# Altium footprint library microbuilder.PCBLIB: 422 footprints (part 15 of 27)
Each footprint in its own frame and in the unit in brackets; x right, y up, seen from the top. Pads: shape width x height; smd on the part's side, far side on the other; paste and mask are expansions set on the pad; w line width, h text height; cw(c..) or ccw(c..) is an arc to the next point about the centre after c.
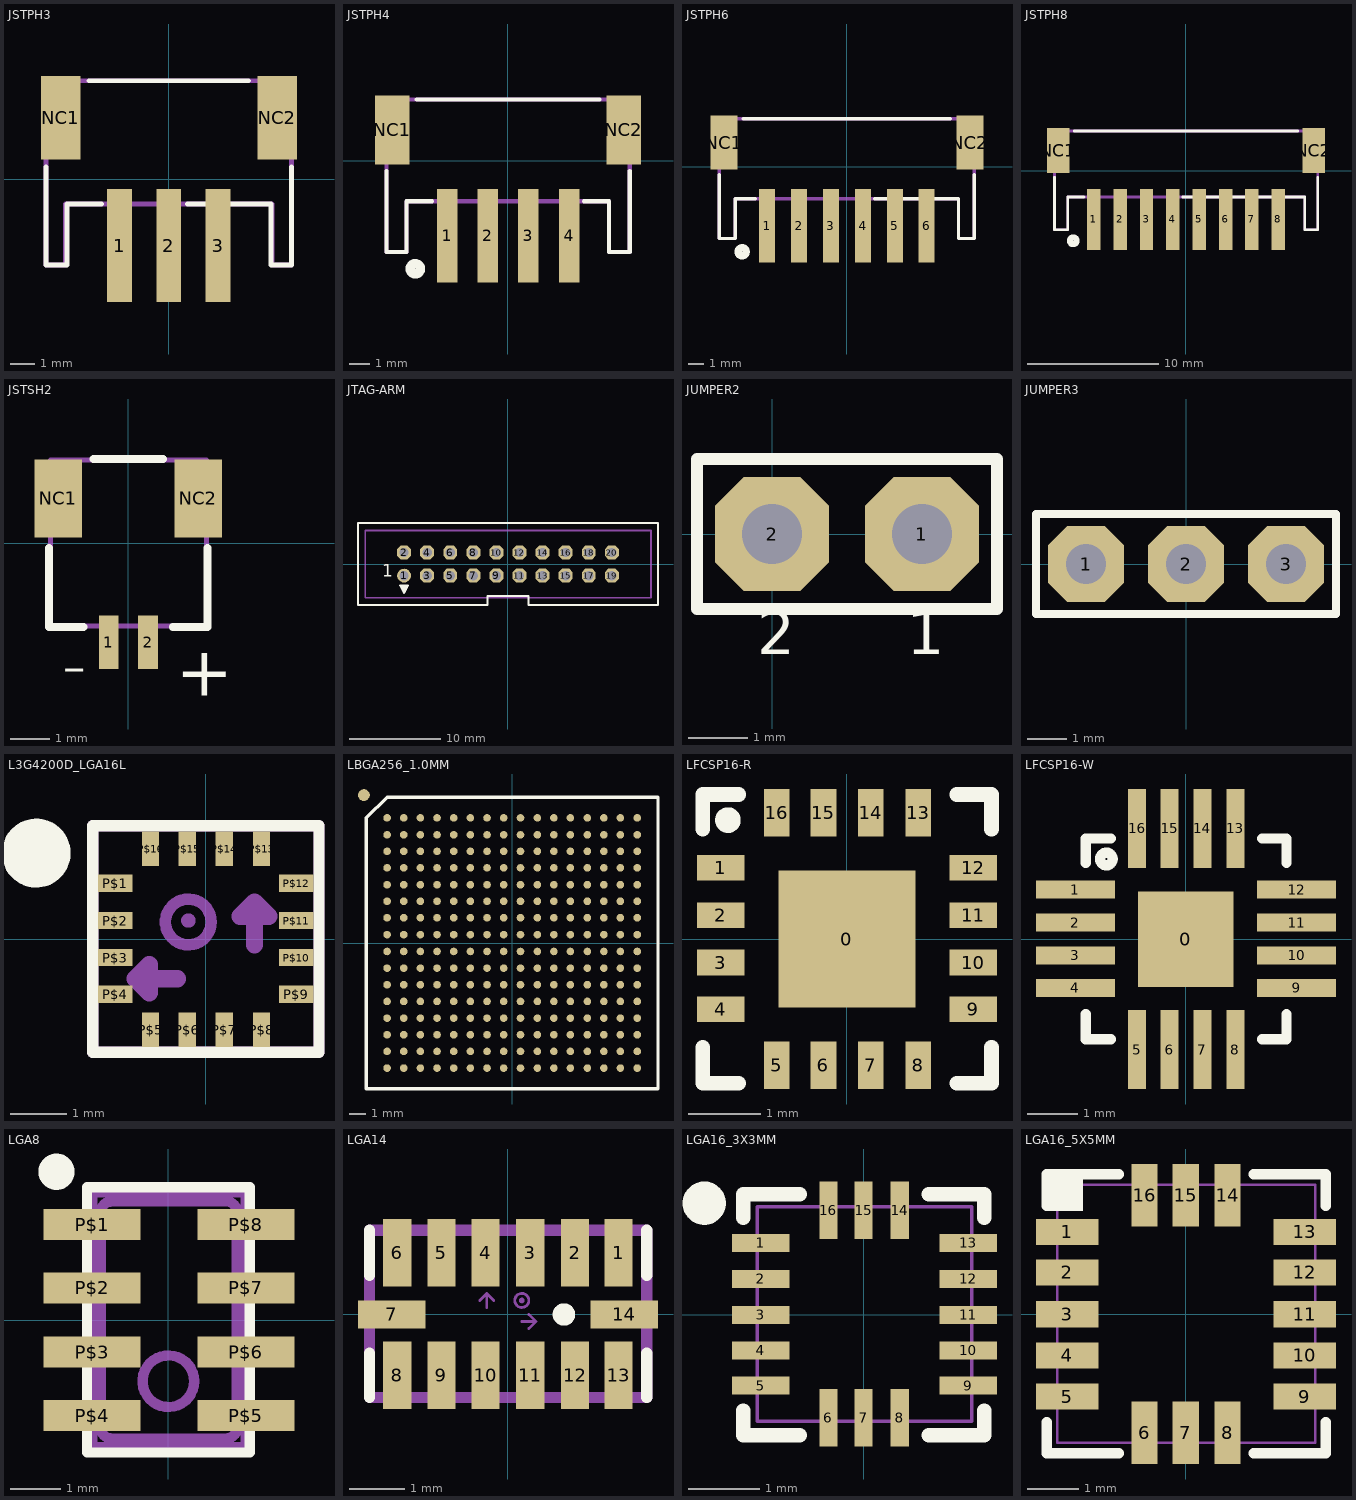
[diagram p14: the footprints below, top view; thin cyan lines are the x and y axes]

## JSTPH3 [mil]
pads (5):
  rect 40x182 smd: 1(-78.74,-106.3) 2(0,-106.3) 3(79,-106.3)
  rect 63x134 smd: NC1(-173.23,99) NC2(174,99)
Top Overlay:
  lines w8: -196.85,20 -196.85,-137.8 -163.39,-137.8 -163.39,-39.37 -108.27,-39.37 ; -127.95,158 128,158 ; 30,-39.37 164,-39.37 164,-137.8 197,-137.8 197,20
Mechanical 16:
  lines w8: -196.85,-137.8 -196.85,158 197,158 197,-137.8 166,-137.8 166,-39.37 -165.35,-39.37 -165.35,-137.8 -196.85,-137.8

## JSTPH4 [mil]
pads (6):
  rect 40x182 smd: 1(-118.11,-145.67) 2(-39.37,-145.67) 3(40,-145.67) 4(119,-145.67)
  rect 67x134 smd: NC1(-224.41,60) NC2(225,60)
Top Overlay:
  circle w18: c-180,-210 r10
  lines w8: -236.22,-19.68 -236.22,-177.17 -196.85,-177.17 -196.85,-78.74 -147.64,-78.74 ; -177.17,119 178,119 ; 148,-78.74 197,-78.74 197,-177.17 237,-177.17 237,-19.68
Mechanical 16:
  lines w8: -236.22,-177.17 -236.22,119 237,119 237,-177.17 197,-177.17 197,-78.74 -196.85,-78.74 -196.85,-177.17 -236.22,-177.17

## JSTPH6 [mil]
pads (8):
  rect 40x182 smd: 1(-196.85,-145.67) 2(-118.11,-145.67) 3(-39.37,-145.67) 4(40,-145.67) 5(119,-145.67) 6(197,-145.67)
  rect 67x134 smd: NC1(-303.15,60) NC2(304,60)
Top Overlay:
  circle w18: c-258.74,-210 r10
  lines w8: -314.96,-19.68 -314.96,-177.17 -275.59,-177.17 -275.59,-78.74 -226.38,-78.74 ; -255.91,119 256,119 ; 69,-78.74 276,-78.74 276,-177.17 315,-177.17 315,-19.68
Mechanical 16:
  lines w8: -314.96,-177.17 -314.96,119 315,119 315,-177.17 276,-177.17 276,-78.74 -275.59,-78.74 -275.59,-177.17 -314.96,-177.17

## JSTPH8 [mil]
pads (10):
  rect 40x182 smd: 1(-275.59,-145.67) 2(-196.85,-145.67) 3(-118.11,-145.67) 4(-39.37,-145.67) 5(40,-145.67) 6(119,-145.67) 7(197,-145.67) 8(276,-145.67)
  rect 67x134 smd: NC1(-381.89,60) NC2(382,60)
Top Overlay:
  circle w18: c-337.48,-210 r10
  lines w8: -393.7,-19.68 -393.7,-177.17 -354.33,-177.17 -354.33,-78.74 -305.12,-78.74 ; -334.65,119 335,119 ; -9.84,-78.74 355,-78.74 355,-177.17 394,-177.17 394,-19.68
Mechanical 16:
  lines w8: -393.7,-177.17 -393.7,119 394,119 394,-177.17 355,-177.17 355,-78.74 -354.33,-78.74 -354.33,-177.17 -393.7,-177.17

## JSTSH2 [mil]
pads (4):
  rect 20x54 smd: 1(-19.68,-100.39) 2(20,-100.39)
  rect 48x79 smd: NC1(-70.87,45) NC2(71,45)
Top Overlay:
  lines w8: -80,-5 -80,-85 -45,-85 ; -35,85 35,85 ; 45,-85 80,-85 80,-5
  text "-" at -41.85,-94.65 h86.8
  text "+" at 106,-94.65 h86.8
Mechanical 1:
  lines w5: -78.74,-83.66 -78.74,84 79,84 79,-83.66 -78.74,-83.66

## JTAG-ARM [mil]
pads (20):
  round 60 hole 40: 1(-450,-50)
  oct 60x60 hole 40: 2(-450,50) 3(-350,-50) 4(-350,50) 5(-250,-50) 6(-250,50) 7(-150,-50) 8(-150,50) 9(-50,-50) 10(-50,50) 11(50,-50) 12(50,50) 13(150,-50) 14(150,50) 15(250,-50) 16(250,50) 17(350,-50) 18(350,50) 19(450,-50) 20(450,50)
Top Overlay:
  rectangle: -460,-109 -440,-99
  rectangle: -465,-99 -450,-94
  rectangle: -450,-99 -435,-94
  rectangle: -455,-117 -445,-107
  lines w8: -450,-115 -450,-125 ; -450,-125 -433,-92 -467,-92 -450,-125 ; -649.61,-177.17 -649.61,178 650,178 650,-177.17 89,-177.17 89,-137.8 -88.58,-137.8 -88.58,-177.17 -649.61,-177.17
  text "1" at -545,-75 h93
Mechanical 16:
  lines w8: -618.11,-145.67 619,-145.67 619,146 -618.11,146 -618.11,-145.67
  text "JTAG" at -125,-135 h77.5

## JUMPER2 [mil]
pads (2):
  oct 76x76 hole 40: 1(100,0) 2(0,0)
Top Overlay:
  lines w8: -50,-50 -50,50 150,50 150,-50 -50,-50
  text "2" at -10,-90 h49.6
  text "1" at 90,-90 h49.6
Mechanical 16:
  region: 12,-12 12,12 -12,12 -12,-12
  region: 112,-12 112,12 88,12 88,-12

## JUMPER3 [mil]
pads (3):
  oct 76x76 hole 40: 1(-100,0) 2(0,0) 3(100,0)
Top Overlay:
  lines w8: -150,-50 150,-50 150,50 -150,50 -150,-50
Mechanical 16:
  rectangle: -112,-12 -88,12
  rectangle: -12,-12 12,12
  rectangle: 88,-12 112,12
  text "1" at -110,-105 h49.6
  text "2" at -13,-105 h49.6
  text "3" at 88,-105 h49.6

## L3G4200D_LGA16L [mil]
pads (16):
  rect 24x12 smd: P$1(-62.99,39) P$2(-62.99,13) P$3(-62.99,-12.8) P$4(-62.99,-38.39) P$9(63,-38.39) P$10(63,-12.8) P$11(63,13) P$12(63,39)
  rect 12x24 smd: P$5(-38.39,-62.99) P$6(-12.8,-62.99) P$7(13,-62.99) P$8(39,-62.99) P$13(39,63) P$14(13,63) P$15(-12.8,63) P$16(-38.39,63)
Top Overlay:
  circle w24: c-118.11,60 r12
  lines w8: -78.74,-78.74 79,-78.74 79,79 -78.74,79 -78.74,-78.74
Mechanical 16:
  circle w8: c-12.06,12 r16
  circle w8: c-12.06,13 r1
  lines w8: -78.74,-78.74 79,-78.74 79,79 -78.74,79 -78.74,-78.74
  lines w12: -19.68,-27.56 -49.21,-27.56 ; 34,-3.94 34,26 ; -49.21,-27.56 -39.37,-37.4 -39.37,-17.72 -49.21,-27.56 ; 34,26 24,16 44,16 34,26
  text "XY" at -6.06,-44.88 h49.6
  text "Z" at -23.28,51 h37.2

## LBGA256_1.0MM [mil]
pads (257):
  rrect100% 18x18 smd: A1(-295.28,296) A2(-255.91,296) A3(-216.54,296) A4(-177.17,296) A5(-137.8,296) A6(-98.43,296) A7(-59.06,296) A8(-19.68,296) A9(20,296) A10(60,296) A11(99,296) A12(138,296) A13(178,296) A14(217,296) A15(256,296) A16(296,296) B1(-295.28,256) B2(-255.91,256) B3(-216.54,256) B4(-177.17,256) B5(-137.8,256) B6(-98.43,256) B7(-59.06,256) B8(-19.68,256) B9(20,256) B10(60,256) B11(99,256) B12(138,256) B13(178,256) B14(217,256) B15(256,256) B16(296,256) C1(-295.28,217) C2(-255.91,217) C3(-216.54,217) C4(-177.17,217) C5(-137.8,217) C6(-98.43,217) C7(-59.06,217) C8(-19.68,217) C9(20,217) C10(60,217) C11(99,217) C12(138,217) C13(178,217) C14(217,217) C15(256,217) C16(296,217) D1(-295.28,178) D2(-255.91,178) D3(-216.54,178) D4(-177.17,178) D5(-137.8,178) D6(-98.43,178) D7(-59.06,178) D8(-19.68,178) D9(20,178) D10(60,178) D11(99,178) D12(138,178) D13(178,178) D14(217,178) D15(256,178) D16(296,178) E1(-295.28,138) E2(-255.91,138) E3(-216.54,138) E4(-177.17,138) E5(-137.8,138) E6(-98.43,138) E7(-59.06,138) E8(-19.68,138) E9(20,138) E10(60,138) E11(99,138) E12(138,138) E13(178,138) E14(217,138) E15(256,138) E16(296,138) F1(-295.28,99) F2(-255.91,99) F3(-216.54,99) F4(-177.17,99) F5(-137.8,99) F6(-98.43,99) F7(-59.06,99) F8(-19.68,99) F9(20,99) F10(60,99) F11(99,99) F12(138,99) F13(178,99) F14(217,99) F15(256,99) F16(296,99) G1(-295.28,60) G2(-255.91,60) G3(-216.54,60) G4(-177.17,60) G5(-137.8,60) G6(-98.43,60) G7(-59.06,60) G8(-19.68,60) G9(20,60) G10(60,60) G11(99,60) G12(138,60) G13(178,60) G14(217,60) G15(256,60) G16(296,60) H1(-295.28,20) H2(-255.91,20) H3(-216.54,20) H4(-177.17,20) H5(-137.8,20) H6(-98.43,20) H7(-59.06,20) H8(-19.68,20) H9(20,20) H10(60,20) H11(99,20) H12(138,20) H13(178,20) H14(217,20) H15(256,20) H16(296,20) J1(-295.28,-19.68) J2(-255.91,-19.68) J3(-216.54,-19.68) J4(-177.17,-19.68) J5(-137.8,-19.68) J6(-98.43,-19.68) J7(-59.06,-19.68) J8(-19.68,-19.68) J9(20,-19.68) J10(60,-19.68) J11(99,-19.68) J12(138,-19.68) J13(178,-19.68) J14(217,-19.68) J15(256,-19.68) J16(296,-19.68) K1(-295.28,-59.06) K2(-255.91,-59.06) K3(-216.54,-59.06) K4(-177.17,-59.06) K5(-137.8,-59.06) K6(-98.43,-59.06) K7(-59.06,-59.06) K8(-19.68,-59.06) K9(20,-59.06) K10(60,-59.06) K11(99,-59.06) K12(138,-59.06) K13(178,-59.06) K14(217,-59.06) K15(256,-59.06) K16(296,-59.06) L1(-295.28,-98.43) L2(-255.91,-98.43) L3(-216.54,-98.43) L4(-177.17,-98.43) L5(-137.8,-98.43) L6(-98.43,-98.43) L7(-59.06,-98.43) L8(-19.68,-98.43) L9(20,-98.43) L10(60,-98.43) L11(99,-98.43) L12(138,-98.43) L13(178,-98.43) L14(217,-98.43) L15(256,-98.43) L16(296,-98.43) M1(-295.28,-137.8) M2(-255.91,-137.8) M3(-216.54,-137.8) M4(-177.17,-137.8) M5(-137.8,-137.8) M6(-98.43,-137.8) M7(-59.06,-137.8) M8(-19.68,-137.8) M9(20,-137.8) M10(60,-137.8) M11(99,-137.8) M12(138,-137.8) M13(178,-137.8) M14(217,-137.8) M15(256,-137.8) M16(296,-137.8) N1(-295.28,-177.17) N2(-255.91,-177.17) N3(-216.54,-177.17) N4(-177.17,-177.17) N5(-137.8,-177.17) N6(-98.43,-177.17) N7(-59.06,-177.17) N8(-19.68,-177.17) N9(20,-177.17) N10(60,-177.17) N11(99,-177.17) N12(138,-177.17) N13(178,-177.17) N14(217,-177.17) N15(256,-177.17) N16(296,-177.17) P1(-295.28,-216.54) P2(-255.91,-216.54) P3(-216.54,-216.54) P4(-177.17,-216.54) P5(-137.8,-216.54) P6(-98.43,-216.54) P7(-59.06,-216.54) P8(-19.68,-216.54) P9(20,-216.54) P10(60,-216.54) P11(99,-216.54) P12(138,-216.54) P13(178,-216.54) P14(217,-216.54) P15(256,-216.54) P16(296,-216.54) R1(-295.28,-255.91) R2(-255.91,-255.91) R3(-216.54,-255.91) R4(-177.17,-255.91) R5(-137.8,-255.91) R6(-98.43,-255.91) R7(-59.06,-255.91) R8(-19.68,-255.91) R9(20,-255.91) R10(60,-255.91) R11(99,-255.91) R12(138,-255.91) R13(178,-255.91) R14(217,-255.91) R15(256,-255.91) R16(296,-255.91) T1(-295.28,-295.28) T2(-255.91,-295.28) T3(-216.54,-295.28) T4(-177.17,-295.28) T5(-137.8,-295.28) T6(-98.43,-295.28) T7(-59.06,-295.28) T8(-19.68,-295.28) T9(20,-295.28) T10(60,-295.28) T11(99,-295.28) T12(138,-295.28) T13(178,-295.28) T14(217,-295.28) T15(256,-295.28) T16(296,-295.28)
  rrect100% 28x28 smd: FIDUCIAL(-350,350)
Top Overlay:
  lines w8: -344.49,-344.49 345,-344.49 345,345 -295.28,345 -344.49,296 -344.49,-344.49
Top Solder:
  drawing of 256 lines, arcs and shapes, not listed

## LFCSP16-R [mil]
pads (17):
  rect 75x75 smd: 0(0,0)
  rect 26x14 smd: 1(-68.9,39) 2(-68.9,13) 3(-68.9,-12.8) 4(-68.9,-38.39) 9(69,-38.39) 10(69,-12.8) 11(69,13) 12(69,39)
  rect 14x26 smd: 5(-38.39,-68.9) 6(-12.8,-68.9) 7(13,-68.9) 8(39,-68.9) 13(39,69) 14(13,69) 15(-12.8,69) 16(-38.39,69)
Top Overlay:
  circle w8: c-65,65 r3
  lines w8: -78.74,-59.06 -78.74,-78.74 -59.06,-78.74 ; -78.74,60 -78.74,79 -59.06,79 ; 60,-78.74 79,-78.74 79,-59.06 ; 60,79 79,79 79,60
Top Paste:
  rectangle: -9.84,-9.84 10,10

## LFCSP16-W [mil]
pads (17):
  rect 75x75 smd: 0(0,0)
  rect 62x14 smd: 1(-86.77,39) 2(-86.77,13) 3(-86.77,-12.8) 4(-86.77,-38.39) 9(87,-38.39) 10(87,-12.8) 11(87,13) 12(87,39)
  rect 14x62 smd: 5(-38.39,-86.77) 6(-12.8,-86.77) 7(13,-86.77) 8(39,-86.77) 13(39,87) 14(13,87) 15(-12.8,87) 16(-38.39,87)
Top Overlay:
  circle w8: c-62.5,63 r5
  lines w8: -78.74,-59.06 -78.74,-78.74 -59.06,-78.74 ; -78.74,60 -78.74,79 -59.06,79 ; 60,-78.74 79,-78.74 79,-59.06 ; 60,79 79,79 79,60
Top Paste:
  rectangle: -38.39,-38.39 39,39
Top Solder:
  rectangle: -80.71,31 -51.18,47
  rectangle: -80.71,5 -51.18,21
  rectangle: -80.71,-20.67 -51.18,-4.92
  rectangle: -80.71,-46.26 -51.18,-30.51
  region: -30.51,-80.71 -30.51,-51.18 -46.26,-51.18 -46.26,-80.71
  region: -4.91,-80.72 -4.91,-51.17 -20.65,-51.17 -20.65,-80.72
  region: 20.89,-80.93 20.89,-50.96 5.14,-50.96 5.14,-80.93
  region: 46.87,-80.94 46.87,-50.94 31.13,-50.94 31.13,-80.94
  region: 81,-30.51 52,-30.51 52,-46.26 81,-46.26
  region: 81,-4.92 52,-4.92 52,-20.67 81,-20.67
  region: 81,21 52,21 52,5 81,5
  region: 81,47 52,47 52,31 81,31
  region: 31.5,81.5 31.5,51.5 46.5,51.5 46.5,81.5
  region: 5.52,81.48 5.52,51.52 20.52,51.52 20.52,81.48
  region: -20.28,81.28 -20.28,51.72 -5.28,51.72 -5.28,81.28
  region: -45.89,81.26 -45.89,51.74 -30.89,51.74 -30.89,81.26
  rectangle: -41.34,-41.34 42,42

## LGA8 [mil]
pads (8):
  rect 75x24 smd: P$1(-59.06,74) P$2(-59.06,25) P$3(-59.06,-24.61) P$4(-59.06,-73.82) P$5(60,-73.82) P$6(60,-24.61) P$7(60,25) P$8(60,74)
Top Overlay:
  circle w16: c-86.61,115 r6
  lines w8: -62.99,-102.36 -62.99,103 63,103 63,-102.36 -62.99,-102.36
Mechanical 16:
  circle w8: c0,-47.24 r20
  lines w8: -59.06,-98.43 60,-98.43 60,99 -59.06,99 -59.06,-98.43 ; -52.17,-83.66 -52.17,84 cw(c-44.23,84.06) -44.29,92 45,92 cw(c45,84) 53,84 53,-83.66 cw(c45.06,-83.6) 45,-91.54 -44.29,-91.54 cw(c-44.29,-83.66) -52.17,-83.66

## LGA14 [mil]
pads (14):
  rect 20x48 smd: 1(79,44) 2(48,44) 3(16,44) 4(-15.75,44) 5(-47.24,44) 6(-78.74,44) 8(-78.74,-43.31) 9(-47.24,-43.31) 10(-15.75,-43.31) 11(16,-43.31) 12(48,-43.31) 13(79,-43.31)
  rect 48x20 smd: 7(-82.68,0) 14(83,0)
Top Overlay:
  circle w8: c40,0 r4
  lines w8: -98.43,-59.06 -98.43,-27.56 ; -98.43,28 -98.43,60 ; 99,-59.06 99,-27.56 ; 99,28 99,60
Mechanical 16:
  circle w2: c10,10 r5
  circle w2: c10,10 r1
  lines w2: -20,10 -15,15 ; -15,5 -15,15 ; -10,10 -15,15 ; 10,-5 20,-5 ; 15,-10 20,-5 ; 15,0 20,-5
  lines w8: -98.43,-59.06 -98.43,60 99,60 99,-59.06 -98.43,-59.06
  text "X" at -5,-10 h18.6
  text "Y" at -20,-10 h18.6
  text "Z" at -5,5 h18.6

## LGA16_3X3MM [mil]
pads (16):
  rect 32x10 smd: 1(-57.09,40) 2(-57.09,20) 3(-57.09,0) 4(-57.09,-19.68) 5(-57.09,-39.37) 9(58,-39.37) 10(58,-19.68) 11(58,0) 12(58,20) 13(58,40)
  rect 10x32 smd: 6(-19.68,-57.09) 7(0,-57.09) 8(20,-57.09) 14(20,58) 15(0,58) 16(-19.68,58)
Top Overlay:
  circle w16: c-88.58,62 r4
  lines w8: -66.93,-53.15 -66.93,-66.93 -35.43,-66.93 ; -66.93,54 -66.93,67 -35.43,67 ; 36,-66.93 67,-66.93 67,-53.15 ; 36,67 67,67 67,54
Mechanical 16:
  lines w2: -59.06,-59.06 60,-59.06 60,60 -59.06,60 -59.06,-59.06

## LGA16_5X5MM [mil]
pads (16):
  rect 48x20 smd: 1(-90.55,63) 2(-90.55,32) 3(-90.55,0) 4(-90.55,-31.5) 5(-90.55,-62.99) 9(91,-62.99) 10(91,-31.5) 11(91,0) 12(91,32) 13(91,63)
  rect 20x48 smd: 6(-31.5,-90.55) 7(0,-90.55) 8(32,-90.55) 14(32,91) 15(0,91) 16(-31.5,91)
Top Overlay:
  rectangle: -106.3,79 -78.74,107
  lines w8: -106.3,-82.68 -106.3,-106.3 -51.18,-106.3 ; -106.3,83 -106.3,107 -51.18,107 ; 52,-106.3 107,-106.3 107,-82.68 ; 52,107 107,107 107,83
Mechanical 16:
  lines w2: -98.43,-98.43 99,-98.43 99,99 -98.43,99 -98.43,-98.43